# Altium schematic symbol library jlcpcb_2025_04_capacitors_extended_0402.schlib: 3594 symbols (part 4 of 20) (continued)
## 04025A8R2CAT2A
designator C?  Capacitance: 8.2pF  (hidden comment: *)
Capacitor, Ceramic (MLCC), 8.2pF, 50V, C0G, SMD 0402; Manufacturer: AVX; Manufacturer Part Number: 04025A8R2CAT2A; Package Size: 0402; JLCPCB Basic Part: No; JLCPCB Part Number: C167419; Supplier 1: LCSC; Category: Capacitors - MLCC; Supplier Part Number 1: C167419; Voltage Rating: 50V; Temperature Coefficient: C0G; RoHS: Yes; ComponentLink1Description: Datasheet; ComponentLink1URL: https://wmsc.lcsc.com/wmsc/upload/file/pdf/v2/lcsc/2304140030_Kyocera-AVX-04025A8R2CAT2A_C167419.pdf; ComponentLink2Description: JLCPCB Part URL; ComponentLink2URL: https://jlcpcb.com/partdetail/C167419; ComponentLink3Description: LCSC Part URL; ComponentLink3URL: https://lcsc.com/product-detail/Multilayer-Ceramic-Capacitors-MLCC---SMD-SMT_Kyocera-AVX-Kyocera-AVX-04025A8R2CAT2A_C167419.html
footprint CAP-0402 (0402 (1005M) Capacitor)
pins: 1, 2

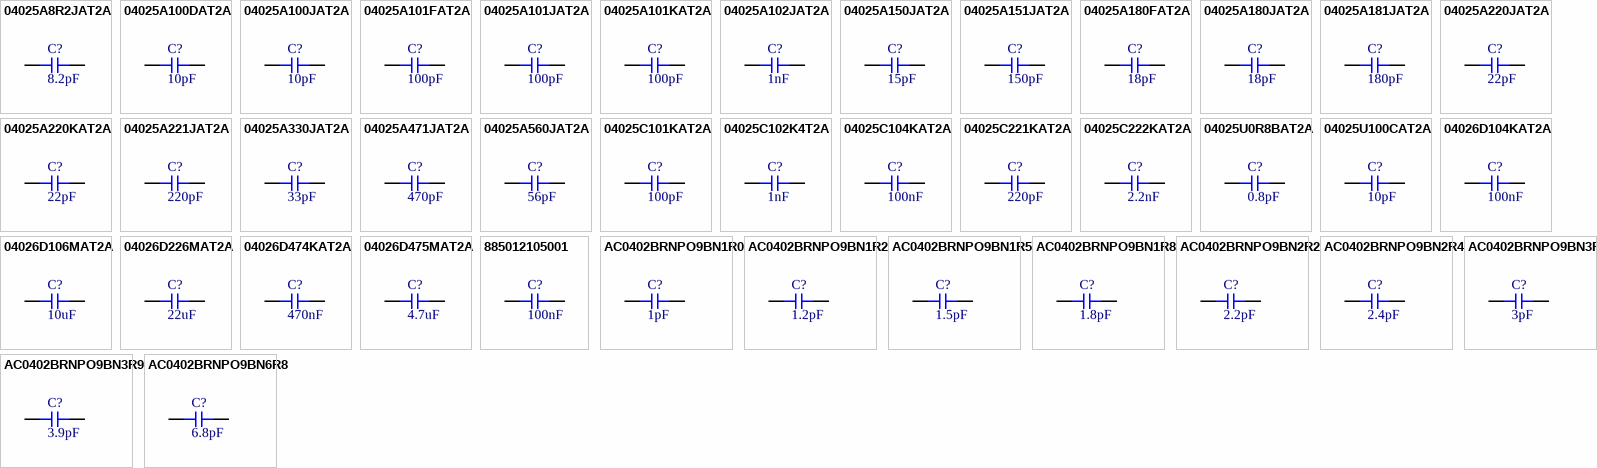
[diagram p16: symbols 04025A8R2JAT2A to AC0402BRNPO9BN6R8]

## 04025A8R2JAT2A
designator C?  Capacitance: 8.2pF  (hidden comment: *)
Capacitor, Ceramic (MLCC), 8.2pF, ±5%, 50V, C0G, ±5%, SMD 0402; Manufacturer: Kyocera AVX; Manufacturer Part Number: 04025A8R2JAT2A; Package Size: 0402; JLCPCB Basic Part: No; JLCPCB Part Number: C2180688; Supplier 1: LCSC; Category: Capacitors - MLCC; Supplier Part Number 1: C2180688; Tolerance: ±5%; Voltage Rating: 50V; Temperature Coefficient: C0G; RoHS: Yes; ComponentLink1Description: Datasheet; ComponentLink1URL: https://wmsc.lcsc.com/wmsc/upload/file/pdf/v2/lcsc/2304140030_Kyocera-AVX-04025A8R2JAT2A_C2180688.pdf; ComponentLink2Description: JLCPCB Part URL; ComponentLink2URL: https://jlcpcb.com/partdetail/C2180688; ComponentLink3Description: LCSC Part URL; ComponentLink3URL: https://lcsc.com/product-detail/Multilayer-Ceramic-Capacitors-MLCC---SMD-SMT_Kyocera-AVX-Kyocera-AVX-04025A8R2JAT2A_C2180688.html
footprint CAP-0402 (0402 (1005M) Capacitor)
pins: 1, 2

## 04025A100DAT2A
designator C?  Capacitance: 10pF  (hidden comment: *)
Capacitor, Ceramic (MLCC), 10pF, 50V, C0G, SMD 0402; Manufacturer: AVX; Manufacturer Part Number: 04025A100DAT2A; Package Size: 0402; JLCPCB Basic Part: No; JLCPCB Part Number: C167427; Supplier 1: LCSC; Category: Capacitors - MLCC; Supplier Part Number 1: C167427; Voltage Rating: 50V; Temperature Coefficient: C0G; RoHS: Yes; ComponentLink1Description: Datasheet; ComponentLink1URL: https://wmsc.lcsc.com/wmsc/upload/file/pdf/v2/lcsc/2304140030_Kyocera-AVX-04025A100DAT2A_C167427.pdf; ComponentLink2Description: JLCPCB Part URL; ComponentLink2URL: https://jlcpcb.com/partdetail/C167427; ComponentLink3Description: LCSC Part URL; ComponentLink3URL: https://lcsc.com/product-detail/Multilayer-Ceramic-Capacitors-MLCC---SMD-SMT_Kyocera-AVX-Kyocera-AVX-04025A100DAT2A_C167427.html
footprint CAP-0402 (0402 (1005M) Capacitor)
pins: 1, 2

## 04025A100JAT2A
designator C?  Capacitance: 10pF  (hidden comment: *)
Capacitor, Ceramic (MLCC), 10pF, ±5%, 50V, C0G, ±5%, SMD 0402; Manufacturer: AVX; Manufacturer Part Number: 04025A100JAT2A; Package Size: 0402; JLCPCB Basic Part: No; JLCPCB Part Number: C513314; Supplier 1: LCSC; Category: Capacitors - MLCC; Supplier Part Number 1: C513314; Tolerance: ±5%; Voltage Rating: 50V; Temperature Coefficient: C0G; RoHS: Yes; ComponentLink1Description: Datasheet; ComponentLink1URL: https://wmsc.lcsc.com/wmsc/upload/file/pdf/v2/lcsc/2304140030_Kyocera-AVX-04025A100JAT2A_C513314.pdf; ComponentLink2Description: JLCPCB Part URL; ComponentLink2URL: https://jlcpcb.com/partdetail/C513314; ComponentLink3Description: LCSC Part URL; ComponentLink3URL: https://lcsc.com/product-detail/Multilayer-Ceramic-Capacitors-MLCC---SMD-SMT_Kyocera-AVX-Kyocera-AVX-04025A100JAT2A_C513314.html
footprint CAP-0402 (0402 (1005M) Capacitor)
pins: 1, 2

## 04025A101FAT2A
designator C?  Capacitance: 100pF  (hidden comment: *)
Capacitor, Ceramic (MLCC), 100pF, ±1%, 50V, C0G, ±1%, SMD 0402; Manufacturer: AVX; Manufacturer Part Number: 04025A101FAT2A; Package Size: 0402; JLCPCB Basic Part: No; JLCPCB Part Number: C597012; Supplier 1: LCSC; Category: Capacitors - MLCC; Supplier Part Number 1: C597012; Tolerance: ±1%; Voltage Rating: 50V; Temperature Coefficient: C0G; RoHS: Yes; ComponentLink1Description: Datasheet; ComponentLink1URL: https://wmsc.lcsc.com/wmsc/upload/file/pdf/v2/lcsc/2304140030_Kyocera-AVX-04025A101FAT2A_C597012.pdf; ComponentLink2Description: JLCPCB Part URL; ComponentLink2URL: https://jlcpcb.com/partdetail/C597012; ComponentLink3Description: LCSC Part URL; ComponentLink3URL: https://lcsc.com/product-detail/Multilayer-Ceramic-Capacitors-MLCC---SMD-SMT_Kyocera-AVX-Kyocera-AVX-04025A101FAT2A_C597012.html
footprint CAP-0402 (0402 (1005M) Capacitor)
pins: 1, 2

## 04025A101JAT2A
designator C?  Capacitance: 100pF  (hidden comment: *)
Capacitor, Ceramic (MLCC), 100pF, ±5%, 50V, C0G, ±5%, SMD 0402; Manufacturer: AVX; Manufacturer Part Number: 04025A101JAT2A; Package Size: 0402; JLCPCB Basic Part: No; JLCPCB Part Number: C597014; Supplier 1: LCSC; Category: Capacitors - MLCC; Supplier Part Number 1: C597014; Tolerance: ±5%; Voltage Rating: 50V; Temperature Coefficient: C0G; RoHS: Yes; ComponentLink1Description: Datasheet; ComponentLink1URL: https://wmsc.lcsc.com/wmsc/upload/file/pdf/v2/lcsc/2304140030_Kyocera-AVX-04025A101JAT2A_C597014.pdf; ComponentLink2Description: JLCPCB Part URL; ComponentLink2URL: https://jlcpcb.com/partdetail/C597014; ComponentLink3Description: LCSC Part URL; ComponentLink3URL: https://lcsc.com/product-detail/Multilayer-Ceramic-Capacitors-MLCC---SMD-SMT_Kyocera-AVX-Kyocera-AVX-04025A101JAT2A_C597014.html
footprint CAP-0402 (0402 (1005M) Capacitor)
pins: 1, 2

## 04025A101KAT2A
designator C?  Capacitance: 100pF  (hidden comment: *)
Capacitor, Ceramic (MLCC), 100pF, ±10%, 50V, C0G, ±10%, SMD 0402; Manufacturer: AVX; Manufacturer Part Number: 04025A101KAT2A; Package Size: 0402; JLCPCB Basic Part: No; JLCPCB Part Number: C597015; Supplier 1: LCSC; Category: Capacitors - MLCC; Supplier Part Number 1: C597015; Tolerance: ±10%; Voltage Rating: 50V; Temperature Coefficient: C0G; RoHS: Yes; ComponentLink1Description: Datasheet; ComponentLink1URL: https://wmsc.lcsc.com/wmsc/upload/file/pdf/v2/lcsc/2304140030_Kyocera-AVX-04025A101KAT2A_C597015.pdf; ComponentLink2Description: JLCPCB Part URL; ComponentLink2URL: https://jlcpcb.com/partdetail/C597015; ComponentLink3Description: LCSC Part URL; ComponentLink3URL: https://lcsc.com/product-detail/Multilayer-Ceramic-Capacitors-MLCC---SMD-SMT_Kyocera-AVX-Kyocera-AVX-04025A101KAT2A_C597015.html
footprint CAP-0402 (0402 (1005M) Capacitor)
pins: 1, 2

## 04025A102JAT2A
designator C?  Capacitance: 1nF  (hidden comment: *)
Capacitor, Ceramic (MLCC), 1nF, ±5%, 50V, C0G, ±5%, SMD 0402; Manufacturer: AVX; Manufacturer Part Number: 04025A102JAT2A; Package Size: 0402; JLCPCB Basic Part: No; JLCPCB Part Number: C597016; Supplier 1: LCSC; Category: Capacitors - MLCC; Supplier Part Number 1: C597016; Tolerance: ±5%; Voltage Rating: 50V; Temperature Coefficient: C0G; RoHS: Yes; ComponentLink1Description: Datasheet; ComponentLink1URL: https://wmsc.lcsc.com/wmsc/upload/file/pdf/v2/lcsc/2304140030_Kyocera-AVX-04025A102JAT2A_C597016.pdf; ComponentLink2Description: JLCPCB Part URL; ComponentLink2URL: https://jlcpcb.com/partdetail/C597016; ComponentLink3Description: LCSC Part URL; ComponentLink3URL: https://lcsc.com/product-detail/Multilayer-Ceramic-Capacitors-MLCC---SMD-SMT_Kyocera-AVX-Kyocera-AVX-04025A102JAT2A_C597016.html
footprint CAP-0402 (0402 (1005M) Capacitor)
pins: 1, 2

## 04025A150JAT2A
designator C?  Capacitance: 15pF  (hidden comment: *)
Capacitor, Ceramic (MLCC), 15pF, ±5%, 50V, C0G, ±5%, SMD 0402; Manufacturer: AVX; Manufacturer Part Number: 04025A150JAT2A; Package Size: 0402; JLCPCB Basic Part: No; JLCPCB Part Number: C513315; Supplier 1: LCSC; Category: Capacitors - MLCC; Supplier Part Number 1: C513315; Tolerance: ±5%; Voltage Rating: 50V; Temperature Coefficient: C0G; RoHS: Yes; ComponentLink1Description: Datasheet; ComponentLink1URL: https://wmsc.lcsc.com/wmsc/upload/file/pdf/v2/lcsc/2304140030_Kyocera-AVX-04025A150JAT2A_C513315.pdf; ComponentLink2Description: JLCPCB Part URL; ComponentLink2URL: https://jlcpcb.com/partdetail/C513315; ComponentLink3Description: LCSC Part URL; ComponentLink3URL: https://lcsc.com/product-detail/Multilayer-Ceramic-Capacitors-MLCC---SMD-SMT_Kyocera-AVX-Kyocera-AVX-04025A150JAT2A_C513315.html
footprint CAP-0402 (0402 (1005M) Capacitor)
pins: 1, 2

## 04025A151JAT2A
designator C?  Capacitance: 150pF  (hidden comment: *)
Capacitor, Ceramic (MLCC), 150pF, ±5%, 50V, C0G, ±5%, SMD 0402; Manufacturer: Kyocera AVX; Manufacturer Part Number: 04025A151JAT2A; Package Size: 0402; JLCPCB Basic Part: No; JLCPCB Part Number: C2169331; Supplier 1: LCSC; Category: Capacitors - MLCC; Supplier Part Number 1: C2169331; Tolerance: ±5%; Voltage Rating: 50V; Temperature Coefficient: C0G; RoHS: Yes; ComponentLink1Description: Datasheet; ComponentLink1URL: https://wmsc.lcsc.com/wmsc/upload/file/pdf/v2/lcsc/2304140030_Kyocera-AVX-04025A151JAT2A_C2169331.pdf; ComponentLink2Description: JLCPCB Part URL; ComponentLink2URL: https://jlcpcb.com/partdetail/C2169331; ComponentLink3Description: LCSC Part URL; ComponentLink3URL: https://lcsc.com/product-detail/Multilayer-Ceramic-Capacitors-MLCC---SMD-SMT_Kyocera-AVX-Kyocera-AVX-04025A151JAT2A_C2169331.html
footprint CAP-0402 (0402 (1005M) Capacitor)
pins: 1, 2

## 04025A180FAT2A
designator C?  Capacitance: 18pF  (hidden comment: *)
Capacitor, Ceramic (MLCC), 18pF, ±1%, 50V, C0G, ±1%, SMD 0402; Manufacturer: AVX; Manufacturer Part Number: 04025A180FAT2A; Package Size: 0402; JLCPCB Basic Part: No; JLCPCB Part Number: C597018; Supplier 1: LCSC; Category: Capacitors - MLCC; Supplier Part Number 1: C597018; Tolerance: ±1%; Voltage Rating: 50V; Temperature Coefficient: C0G; RoHS: Yes; ComponentLink1Description: Datasheet; ComponentLink1URL: https://wmsc.lcsc.com/wmsc/upload/file/pdf/v2/lcsc/2304140030_Kyocera-AVX-04025A180FAT2A_C597018.pdf; ComponentLink2Description: JLCPCB Part URL; ComponentLink2URL: https://jlcpcb.com/partdetail/C597018; ComponentLink3Description: LCSC Part URL; ComponentLink3URL: https://lcsc.com/product-detail/Multilayer-Ceramic-Capacitors-MLCC---SMD-SMT_Kyocera-AVX-Kyocera-AVX-04025A180FAT2A_C597018.html
footprint CAP-0402 (0402 (1005M) Capacitor)
pins: 1, 2

## 04025A180JAT2A
designator C?  Capacitance: 18pF  (hidden comment: *)
Capacitor, Ceramic (MLCC), 18pF, ±5%, 50V, C0G, ±5%, SMD 0402; Manufacturer: AVX; Manufacturer Part Number: 04025A180JAT2A; Package Size: 0402; JLCPCB Basic Part: No; JLCPCB Part Number: C513316; Supplier 1: LCSC; Category: Capacitors - MLCC; Supplier Part Number 1: C513316; Tolerance: ±5%; Voltage Rating: 50V; Temperature Coefficient: C0G; RoHS: Yes; ComponentLink1Description: Datasheet; ComponentLink1URL: https://wmsc.lcsc.com/wmsc/upload/file/pdf/v2/lcsc/2304140030_Kyocera-AVX-04025A180JAT2A_C513316.pdf; ComponentLink2Description: JLCPCB Part URL; ComponentLink2URL: https://jlcpcb.com/partdetail/C513316; ComponentLink3Description: LCSC Part URL; ComponentLink3URL: https://lcsc.com/product-detail/Multilayer-Ceramic-Capacitors-MLCC---SMD-SMT_Kyocera-AVX-Kyocera-AVX-04025A180JAT2A_C513316.html
footprint CAP-0402 (0402 (1005M) Capacitor)
pins: 1, 2

## 04025A181JAT2A
designator C?  Capacitance: 180pF  (hidden comment: *)
Capacitor, Ceramic (MLCC), 180pF, ±5%, 50V, C0G, ±5%, SMD 0402; Manufacturer: Kyocera AVX; Manufacturer Part Number: 04025A181JAT2A; Package Size: 0402; JLCPCB Basic Part: No; JLCPCB Part Number: C2170341; Supplier 1: LCSC; Category: Capacitors - MLCC; Supplier Part Number 1: C2170341; Tolerance: ±5%; Voltage Rating: 50V; Temperature Coefficient: C0G; RoHS: Yes; ComponentLink1Description: Datasheet; ComponentLink1URL: https://wmsc.lcsc.com/wmsc/upload/file/pdf/v2/lcsc/2304140030_Kyocera-AVX-04025A181JAT2A_C2170341.pdf; ComponentLink2Description: JLCPCB Part URL; ComponentLink2URL: https://jlcpcb.com/partdetail/C2170341; ComponentLink3Description: LCSC Part URL; ComponentLink3URL: https://lcsc.com/product-detail/Multilayer-Ceramic-Capacitors-MLCC---SMD-SMT_Kyocera-AVX-Kyocera-AVX-04025A181JAT2A_C2170341.html
footprint CAP-0402 (0402 (1005M) Capacitor)
pins: 1, 2

## 04025A220JAT2A
designator C?  Capacitance: 22pF  (hidden comment: *)
Capacitor, Ceramic (MLCC), 22pF, ±5%, 50V, C0G, ±5%, SMD 0402; Manufacturer: AVX; Manufacturer Part Number: 04025A220JAT2A; Package Size: 0402; JLCPCB Basic Part: No; JLCPCB Part Number: C167428; Supplier 1: LCSC; Category: Capacitors - MLCC; Supplier Part Number 1: C167428; Tolerance: ±5%; Voltage Rating: 50V; Temperature Coefficient: C0G; RoHS: Yes; ComponentLink1Description: Datasheet; ComponentLink1URL: https://wmsc.lcsc.com/wmsc/upload/file/pdf/v2/lcsc/2304140030_Kyocera-AVX-04025A220JAT2A_C167428.pdf; ComponentLink2Description: JLCPCB Part URL; ComponentLink2URL: https://jlcpcb.com/partdetail/C167428; ComponentLink3Description: LCSC Part URL; ComponentLink3URL: https://lcsc.com/product-detail/Multilayer-Ceramic-Capacitors-MLCC---SMD-SMT_Kyocera-AVX-Kyocera-AVX-04025A220JAT2A_C167428.html
footprint CAP-0402 (0402 (1005M) Capacitor)
pins: 1, 2

## 04025A220KAT2A
designator C?  Capacitance: 22pF  (hidden comment: *)
Capacitor, Ceramic (MLCC), 22pF, ±10%, 50V, C0G, ±10%, SMD 0402; Manufacturer: AVX; Manufacturer Part Number: 04025A220KAT2A; Package Size: 0402; JLCPCB Basic Part: No; JLCPCB Part Number: C597024; Supplier 1: LCSC; Category: Capacitors - MLCC; Supplier Part Number 1: C597024; Tolerance: ±10%; Voltage Rating: 50V; Temperature Coefficient: C0G; RoHS: Yes; ComponentLink1Description: Datasheet; ComponentLink1URL: https://wmsc.lcsc.com/wmsc/upload/file/pdf/v2/lcsc/2304140030_Kyocera-AVX-04025A220KAT2A_C597024.pdf; ComponentLink2Description: JLCPCB Part URL; ComponentLink2URL: https://jlcpcb.com/partdetail/C597024; ComponentLink3Description: LCSC Part URL; ComponentLink3URL: https://lcsc.com/product-detail/Multilayer-Ceramic-Capacitors-MLCC---SMD-SMT_Kyocera-AVX-Kyocera-AVX-04025A220KAT2A_C597024.html
footprint CAP-0402 (0402 (1005M) Capacitor)
pins: 1, 2

## 04025A221JAT2A
designator C?  Capacitance: 220pF  (hidden comment: *)
Capacitor, Ceramic (MLCC), 220pF, ±5%, 50V, C0G, ±5%, SMD 0402; Manufacturer: AVX; Manufacturer Part Number: 04025A221JAT2A; Package Size: 0402; JLCPCB Basic Part: No; JLCPCB Part Number: C597026; Supplier 1: LCSC; Category: Capacitors - MLCC; Supplier Part Number 1: C597026; Tolerance: ±5%; Voltage Rating: 50V; Temperature Coefficient: C0G; RoHS: Yes; ComponentLink1Description: Datasheet; ComponentLink1URL: https://wmsc.lcsc.com/wmsc/upload/file/pdf/v2/lcsc/2304140030_Kyocera-AVX-04025A221JAT2A_C597026.pdf; ComponentLink2Description: JLCPCB Part URL; ComponentLink2URL: https://jlcpcb.com/partdetail/C597026; ComponentLink3Description: LCSC Part URL; ComponentLink3URL: https://lcsc.com/product-detail/Multilayer-Ceramic-Capacitors-MLCC---SMD-SMT_Kyocera-AVX-Kyocera-AVX-04025A221JAT2A_C597026.html
footprint CAP-0402 (0402 (1005M) Capacitor)
pins: 1, 2

## 04025A330JAT2A
designator C?  Capacitance: 33pF  (hidden comment: *)
Capacitor, Ceramic (MLCC), 33pF, ±5%, 50V, C0G, ±5%, SMD 0402; Manufacturer: AVX; Manufacturer Part Number: 04025A330JAT2A; Package Size: 0402; JLCPCB Basic Part: No; JLCPCB Part Number: C513317; Supplier 1: LCSC; Category: Capacitors - MLCC; Supplier Part Number 1: C513317; Tolerance: ±5%; Voltage Rating: 50V; Temperature Coefficient: C0G; RoHS: Yes; ComponentLink1Description: Datasheet; ComponentLink1URL: https://wmsc.lcsc.com/wmsc/upload/file/pdf/v2/lcsc/2304140030_Kyocera-AVX-04025A330JAT2A_C513317.pdf; ComponentLink2Description: JLCPCB Part URL; ComponentLink2URL: https://jlcpcb.com/partdetail/C513317; ComponentLink3Description: LCSC Part URL; ComponentLink3URL: https://lcsc.com/product-detail/Multilayer-Ceramic-Capacitors-MLCC---SMD-SMT_Kyocera-AVX-Kyocera-AVX-04025A330JAT2A_C513317.html
footprint CAP-0402 (0402 (1005M) Capacitor)
pins: 1, 2

## 04025A471JAT2A
designator C?  Capacitance: 470pF  (hidden comment: *)
Capacitor, Ceramic (MLCC), 470pF, ±5%, 50V, C0G, ±5%, SMD 0402; Manufacturer: AVX; Manufacturer Part Number: 04025A471JAT2A; Package Size: 0402; JLCPCB Basic Part: No; JLCPCB Part Number: C597032; Supplier 1: LCSC; Category: Capacitors - MLCC; Supplier Part Number 1: C597032; Tolerance: ±5%; Voltage Rating: 50V; Temperature Coefficient: C0G; RoHS: Yes; ComponentLink1Description: Datasheet; ComponentLink1URL: https://wmsc.lcsc.com/wmsc/upload/file/pdf/v2/lcsc/2304140030_Kyocera-AVX-04025A471JAT2A_C597032.pdf; ComponentLink2Description: JLCPCB Part URL; ComponentLink2URL: https://jlcpcb.com/partdetail/C597032; ComponentLink3Description: LCSC Part URL; ComponentLink3URL: https://lcsc.com/product-detail/Multilayer-Ceramic-Capacitors-MLCC---SMD-SMT_Kyocera-AVX-Kyocera-AVX-04025A471JAT2A_C597032.html
footprint CAP-0402 (0402 (1005M) Capacitor)
pins: 1, 2

## 04025A560JAT2A
designator C?  Capacitance: 56pF  (hidden comment: *)
Capacitor, Ceramic (MLCC), 56pF, ±5%, 50V, C0G, ±5%, SMD 0402; Manufacturer: AVX; Manufacturer Part Number: 04025A560JAT2A; Package Size: 0402; JLCPCB Basic Part: No; JLCPCB Part Number: C597034; Supplier 1: LCSC; Category: Capacitors - MLCC; Supplier Part Number 1: C597034; Tolerance: ±5%; Voltage Rating: 50V; Temperature Coefficient: C0G; RoHS: Yes; ComponentLink1Description: Datasheet; ComponentLink1URL: https://wmsc.lcsc.com/wmsc/upload/file/pdf/v2/lcsc/2304140030_Kyocera-AVX-04025A560JAT2A_C597034.pdf; ComponentLink2Description: JLCPCB Part URL; ComponentLink2URL: https://jlcpcb.com/partdetail/C597034; ComponentLink3Description: LCSC Part URL; ComponentLink3URL: https://lcsc.com/product-detail/Multilayer-Ceramic-Capacitors-MLCC---SMD-SMT_Kyocera-AVX-Kyocera-AVX-04025A560JAT2A_C597034.html
footprint CAP-0402 (0402 (1005M) Capacitor)
pins: 1, 2

## 04025C101KAT2A
designator C?  Capacitance: 100pF  (hidden comment: *)
Capacitor, Ceramic (MLCC), 100pF, ±10%, 50V, X7R, ±10%, SMD 0402; Manufacturer: Kyocera AVX; Manufacturer Part Number: 04025C101KAT2A; Package Size: 0402; JLCPCB Basic Part: No; JLCPCB Part Number: C2155182; Supplier 1: LCSC; Category: Capacitors - MLCC; Supplier Part Number 1: C2155182; Tolerance: ±10%; Voltage Rating: 50V; Temperature Coefficient: X7R; RoHS: Yes; ComponentLink1Description: Datasheet; ComponentLink1URL: https://wmsc.lcsc.com/wmsc/upload/file/pdf/v2/lcsc/2304140030_Kyocera-AVX-04025C101KAT2A_C2155182.pdf; ComponentLink2Description: JLCPCB Part URL; ComponentLink2URL: https://jlcpcb.com/partdetail/C2155182; ComponentLink3Description: LCSC Part URL; ComponentLink3URL: https://lcsc.com/product-detail/Multilayer-Ceramic-Capacitors-MLCC---SMD-SMT_Kyocera-AVX-Kyocera-AVX-04025C101KAT2A_C2155182.html
footprint CAP-0402 (0402 (1005M) Capacitor)
pins: 1, 2

## 04025C102K4T2A
designator C?  Capacitance: 1nF  (hidden comment: *)
Capacitor, Ceramic (MLCC), 1nF, ±10%, 50V, X7R, ±10%, SMD 0402; Manufacturer: AVX; Manufacturer Part Number: 04025C102K4T2A; Package Size: 0402; JLCPCB Basic Part: No; JLCPCB Part Number: C779974; Supplier 1: LCSC; Category: Capacitors - MLCC; Supplier Part Number 1: C779974; Tolerance: ±10%; Voltage Rating: 50V; Temperature Coefficient: X7R; RoHS: Yes; ComponentLink1Description: Datasheet; ComponentLink1URL: https://wmsc.lcsc.com/wmsc/upload/file/pdf/v2/lcsc/2304140030_Kyocera-AVX-04025C102K4T2A_C779974.pdf; ComponentLink2Description: JLCPCB Part URL; ComponentLink2URL: https://jlcpcb.com/partdetail/C779974; ComponentLink3Description: LCSC Part URL; ComponentLink3URL: https://lcsc.com/product-detail/Multilayer-Ceramic-Capacitors-MLCC---SMD-SMT_Kyocera-AVX-Kyocera-AVX-04025C102K4T2A_C779974.html
footprint CAP-0402 (0402 (1005M) Capacitor)
pins: 1, 2

## 04025C104KAT2A
designator C?  Capacitance: 100nF  (hidden comment: *)
Capacitor, Ceramic (MLCC), 100nF, ±10%, 50V, X7R, ±10%, SMD 0402; Manufacturer: Kyocera AVX; Manufacturer Part Number: 04025C104KAT2A; Package Size: 0402; JLCPCB Basic Part: No; JLCPCB Part Number: C2167244; Supplier 1: LCSC; Category: Capacitors - MLCC; Supplier Part Number 1: C2167244; Tolerance: ±10%; Voltage Rating: 50V; Temperature Coefficient: X7R; RoHS: Yes; ComponentLink1Description: Datasheet; ComponentLink1URL: https://wmsc.lcsc.com/wmsc/upload/file/pdf/v2/lcsc/2304140030_Kyocera-AVX-04025C104KAT2A_C2167244.pdf; ComponentLink2Description: JLCPCB Part URL; ComponentLink2URL: https://jlcpcb.com/partdetail/C2167244; ComponentLink3Description: LCSC Part URL; ComponentLink3URL: https://lcsc.com/product-detail/Multilayer-Ceramic-Capacitors-MLCC---SMD-SMT_Kyocera-AVX-Kyocera-AVX-04025C104KAT2A_C2167244.html
footprint CAP-0402 (0402 (1005M) Capacitor)
pins: 1, 2

## 04025C221KAT2A
designator C?  Capacitance: 220pF  (hidden comment: *)
Capacitor, Ceramic (MLCC), 220pF, ±10%, 50V, X7R, ±10%, SMD 0402; Manufacturer: AVX; Manufacturer Part Number: 04025C221KAT2A; Package Size: 0402; JLCPCB Basic Part: No; JLCPCB Part Number: C513319; Supplier 1: LCSC; Category: Capacitors - MLCC; Supplier Part Number 1: C513319; Tolerance: ±10%; Voltage Rating: 50V; Temperature Coefficient: X7R; RoHS: Yes; ComponentLink1Description: Datasheet; ComponentLink1URL: https://wmsc.lcsc.com/wmsc/upload/file/pdf/v2/lcsc/2304140030_Kyocera-AVX-04025C221KAT2A_C513319.pdf; ComponentLink2Description: JLCPCB Part URL; ComponentLink2URL: https://jlcpcb.com/partdetail/C513319; ComponentLink3Description: LCSC Part URL; ComponentLink3URL: https://lcsc.com/product-detail/Multilayer-Ceramic-Capacitors-MLCC---SMD-SMT_Kyocera-AVX-Kyocera-AVX-04025C221KAT2A_C513319.html
footprint CAP-0402 (0402 (1005M) Capacitor)
pins: 1, 2

## 04025C222KAT2A
designator C?  Capacitance: 2.2nF  (hidden comment: *)
Capacitor, Ceramic (MLCC), 2.2nF, ±10%, 50V, X7R, ±10%, SMD 0402; Manufacturer: Kyocera AVX; Manufacturer Part Number: 04025C222KAT2A; Package Size: 0402; JLCPCB Basic Part: No; JLCPCB Part Number: C2167225; Supplier 1: LCSC; Category: Capacitors - MLCC; Supplier Part Number 1: C2167225; Tolerance: ±10%; Voltage Rating: 50V; Temperature Coefficient: X7R; RoHS: Yes; ComponentLink1Description: Datasheet; ComponentLink1URL: https://wmsc.lcsc.com/wmsc/upload/file/pdf/v2/lcsc/2304140030_Kyocera-AVX-04025C222KAT2A_C2167225.pdf; ComponentLink2Description: JLCPCB Part URL; ComponentLink2URL: https://jlcpcb.com/partdetail/C2167225; ComponentLink3Description: LCSC Part URL; ComponentLink3URL: https://lcsc.com/product-detail/Multilayer-Ceramic-Capacitors-MLCC---SMD-SMT_Kyocera-AVX-Kyocera-AVX-04025C222KAT2A_C2167225.html
footprint CAP-0402 (0402 (1005M) Capacitor)
pins: 1, 2

## 04025U0R8BAT2A
designator C?  Capacitance: 0.8pF  (hidden comment: *)
Capacitor, Ceramic (MLCC), 0.8pF, 50V, C0G, SMD 0402; Manufacturer: Kyocera AVX; Manufacturer Part Number: 04025U0R8BAT2A; Package Size: 0402; JLCPCB Basic Part: No; JLCPCB Part Number: C2176642; Supplier 1: LCSC; Category: Capacitors - MLCC; Supplier Part Number 1: C2176642; Voltage Rating: 50V; Temperature Coefficient: C0G; RoHS: Yes; ComponentLink1Description: Datasheet; ComponentLink1URL: https://wmsc.lcsc.com/wmsc/upload/file/pdf/v2/lcsc/2304140030_Kyocera-AVX-04025U0R8BAT2A_C2176642.pdf; ComponentLink2Description: JLCPCB Part URL; ComponentLink2URL: https://jlcpcb.com/partdetail/C2176642; ComponentLink3Description: LCSC Part URL; ComponentLink3URL: https://lcsc.com/product-detail/Multilayer-Ceramic-Capacitors-MLCC---SMD-SMT_Kyocera-AVX-Kyocera-AVX-04025U0R8BAT2A_C2176642.html
footprint CAP-0402 (0402 (1005M) Capacitor)
pins: 1, 2

## 04025U100CAT2A
designator C?  Capacitance: 10pF  (hidden comment: *)
Capacitor, Ceramic (MLCC), 10pF, 50V, C0G, SMD 0402; Manufacturer: Kyocera AVX; Manufacturer Part Number: 04025U100CAT2A; Package Size: 0402; JLCPCB Basic Part: No; JLCPCB Part Number: C2168995; Supplier 1: LCSC; Category: Capacitors - MLCC; Supplier Part Number 1: C2168995; Voltage Rating: 50V; Temperature Coefficient: C0G; RoHS: Yes; ComponentLink1Description: Datasheet; ComponentLink1URL: https://wmsc.lcsc.com/wmsc/upload/file/pdf/v2/lcsc/2304140030_Kyocera-AVX-04025U100CAT2A_C2168995.pdf; ComponentLink2Description: JLCPCB Part URL; ComponentLink2URL: https://jlcpcb.com/partdetail/C2168995; ComponentLink3Description: LCSC Part URL; ComponentLink3URL: https://lcsc.com/product-detail/Multilayer-Ceramic-Capacitors-MLCC---SMD-SMT_Kyocera-AVX-Kyocera-AVX-04025U100CAT2A_C2168995.html
footprint CAP-0402 (0402 (1005M) Capacitor)
pins: 1, 2

## 04026D104KAT2A
designator C?  Capacitance: 100nF  (hidden comment: *)
Capacitor, Ceramic (MLCC), 100nF, ±10%, 6.3V, X5R, ±10%, SMD 0402; Manufacturer: Kyocera AVX; Manufacturer Part Number: 04026D104KAT2A; Package Size: 0402; JLCPCB Basic Part: No; JLCPCB Part Number: C2176584; Supplier 1: LCSC; Category: Capacitors - MLCC; Supplier Part Number 1: C2176584; Tolerance: ±10%; Voltage Rating: 6.3V; Temperature Coefficient: X5R; RoHS: Yes; ComponentLink1Description: Datasheet; ComponentLink1URL: https://wmsc.lcsc.com/wmsc/upload/file/pdf/v2/lcsc/2304140030_Kyocera-AVX-04026D104KAT2A_C2176584.pdf; ComponentLink2Description: JLCPCB Part URL; ComponentLink2URL: https://jlcpcb.com/partdetail/C2176584; ComponentLink3Description: LCSC Part URL; ComponentLink3URL: https://lcsc.com/product-detail/Multilayer-Ceramic-Capacitors-MLCC---SMD-SMT_Kyocera-AVX-Kyocera-AVX-04026D104KAT2A_C2176584.html
footprint CAP-0402 (0402 (1005M) Capacitor)
pins: 1, 2

## 04026D106MAT2A
designator C?  Capacitance: 10uF  (hidden comment: *)
Capacitor, Ceramic (MLCC), 10uF, ±20%, 6.3V, X5R, ±20%, SMD 0402; Manufacturer: Kyocera AVX; Manufacturer Part Number: 04026D106MAT2A; Package Size: 0402; JLCPCB Basic Part: No; JLCPCB Part Number: C2178725; Supplier 1: LCSC; Category: Capacitors - MLCC; Supplier Part Number 1: C2178725; Tolerance: ±20%; Voltage Rating: 6.3V; Temperature Coefficient: X5R; RoHS: Yes; ComponentLink1Description: Datasheet; ComponentLink1URL: https://wmsc.lcsc.com/wmsc/upload/file/pdf/v2/lcsc/2304140030_Kyocera-AVX-04026D106MAT2A_C2178725.pdf; ComponentLink2Description: JLCPCB Part URL; ComponentLink2URL: https://jlcpcb.com/partdetail/C2178725; ComponentLink3Description: LCSC Part URL; ComponentLink3URL: https://lcsc.com/product-detail/Multilayer-Ceramic-Capacitors-MLCC---SMD-SMT_Kyocera-AVX-Kyocera-AVX-04026D106MAT2A_C2178725.html
footprint CAP-0402 (0402 (1005M) Capacitor)
pins: 1, 2

## 04026D226MAT2A
designator C?  Capacitance: 22uF  (hidden comment: *)
Capacitor, Ceramic (MLCC), 22uF, ±20%, 6.3V, X5R, ±20%, SMD 0402; Manufacturer: Kyocera AVX; Manufacturer Part Number: 04026D226MAT2A; Package Size: 0402; JLCPCB Basic Part: No; JLCPCB Part Number: C2179118; Supplier 1: LCSC; Category: Capacitors - MLCC; Supplier Part Number 1: C2179118; Tolerance: ±20%; Voltage Rating: 6.3V; Temperature Coefficient: X5R; RoHS: Yes; ComponentLink1Description: Datasheet; ComponentLink1URL: https://wmsc.lcsc.com/wmsc/upload/file/pdf/v2/lcsc/2304140030_Kyocera-AVX-04026D226MAT2A_C2179118.pdf; ComponentLink2Description: JLCPCB Part URL; ComponentLink2URL: https://jlcpcb.com/partdetail/C2179118; ComponentLink3Description: LCSC Part URL; ComponentLink3URL: https://lcsc.com/product-detail/Multilayer-Ceramic-Capacitors-MLCC---SMD-SMT_Kyocera-AVX-Kyocera-AVX-04026D226MAT2A_C2179118.html
footprint CAP-0402 (0402 (1005M) Capacitor)
pins: 1, 2

## 04026D474KAT2A
designator C?  Capacitance: 470nF  (hidden comment: *)
Capacitor, Ceramic (MLCC), 470nF, ±10%, 6.3V, X5R, ±10%, SMD 0402; Manufacturer: AVX; Manufacturer Part Number: 04026D474KAT2A; Package Size: 0402; JLCPCB Basic Part: No; JLCPCB Part Number: C597049; Supplier 1: LCSC; Category: Capacitors - MLCC; Supplier Part Number 1: C597049; Tolerance: ±10%; Voltage Rating: 6.3V; Temperature Coefficient: X5R; RoHS: Yes; ComponentLink1Description: Datasheet; ComponentLink1URL: https://wmsc.lcsc.com/wmsc/upload/file/pdf/v2/lcsc/2304140030_Kyocera-AVX-04026D474KAT2A_C597049.pdf; ComponentLink2Description: JLCPCB Part URL; ComponentLink2URL: https://jlcpcb.com/partdetail/C597049; ComponentLink3Description: LCSC Part URL; ComponentLink3URL: https://lcsc.com/product-detail/Multilayer-Ceramic-Capacitors-MLCC---SMD-SMT_Kyocera-AVX-Kyocera-AVX-04026D474KAT2A_C597049.html
footprint CAP-0402 (0402 (1005M) Capacitor)
pins: 1, 2

## 04026D475MAT2A
designator C?  Capacitance: 4.7uF  (hidden comment: *)
Capacitor, Ceramic (MLCC), 4.7uF, ±20%, 6.3V, X5R, ±20%, SMD 0402; Manufacturer: Kyocera AVX; Manufacturer Part Number: 04026D475MAT2A; Package Size: 0402; JLCPCB Basic Part: No; JLCPCB Part Number: C2170363; Supplier 1: LCSC; Category: Capacitors - MLCC; Supplier Part Number 1: C2170363; Tolerance: ±20%; Voltage Rating: 6.3V; Temperature Coefficient: X5R; RoHS: Yes; ComponentLink1Description: Datasheet; ComponentLink1URL: https://wmsc.lcsc.com/wmsc/upload/file/pdf/v2/lcsc/2304140030_Kyocera-AVX-04026D475MAT2A_C2170363.pdf; ComponentLink2Description: JLCPCB Part URL; ComponentLink2URL: https://jlcpcb.com/partdetail/C2170363; ComponentLink3Description: LCSC Part URL; ComponentLink3URL: https://lcsc.com/product-detail/Multilayer-Ceramic-Capacitors-MLCC---SMD-SMT_Kyocera-AVX-Kyocera-AVX-04026D475MAT2A_C2170363.html
footprint CAP-0402 (0402 (1005M) Capacitor)
pins: 1, 2

## 885012105001
designator C?  Capacitance: 100nF  (hidden comment: *)
Capacitor, Ceramic (MLCC), 100nF, ±20%, 6.3V, X5R, ±20%, SMD 0402; Manufacturer: Wurth Elektronik; Manufacturer Part Number: 885012105001; Package Size: 0402; JLCPCB Basic Part: No; JLCPCB Part Number: C2176873; Supplier 1: LCSC; Category: Capacitors - MLCC; Supplier Part Number 1: C2176873; Tolerance: ±20%; Voltage Rating: 6.3V; Temperature Coefficient: X5R; RoHS: Yes; ComponentLink1Description: Datasheet; ComponentLink1URL: https://wmsc.lcsc.com/wmsc/upload/file/pdf/v2/lcsc/2401181239_Wurth-Elektronik-885012105001_C2176873.pdf; ComponentLink2Description: JLCPCB Part URL; ComponentLink2URL: https://jlcpcb.com/partdetail/C2176873; ComponentLink3Description: LCSC Part URL; ComponentLink3URL: https://lcsc.com/product-detail/Multilayer-Ceramic-Capacitors-MLCC---SMD-SMT_Wurth-Elektronik-Wurth-Elektronik-885012105001_C2176873.html
footprint CAP-0402 (0402 (1005M) Capacitor)
pins: 1, 2

## AC0402BRNPO9BN1R0
designator C?  Capacitance: 1pF  (hidden comment: *)
Capacitor, Ceramic (MLCC), 1pF, 50V, NP0, SMD 0402; Manufacturer: YAGEO; Manufacturer Part Number: AC0402BRNPO9BN1R0; Package Size: 0402; JLCPCB Basic Part: No; JLCPCB Part Number: C326823; Supplier 1: LCSC; Category: Capacitors - MLCC; Supplier Part Number 1: C326823; Voltage Rating: 50V; Temperature Coefficient: NP0; RoHS: Yes; ComponentLink1Description: Datasheet; ComponentLink1URL: https://wmsc.lcsc.com/wmsc/upload/file/pdf/v2/lcsc/1811151648_YAGEO-AC0402BRNPO9BN1R0_C326823.pdf; ComponentLink2Description: JLCPCB Part URL; ComponentLink2URL: https://jlcpcb.com/partdetail/C326823; ComponentLink3Description: LCSC Part URL; ComponentLink3URL: https://lcsc.com/product-detail/Multilayer-Ceramic-Capacitors-MLCC---SMD-SMT_YAGEO-YAGEO-AC0402BRNPO9BN1R0_C326823.html
footprint CAP-0402 (0402 (1005M) Capacitor)
pins: 1, 2

## AC0402BRNPO9BN1R2
designator C?  Capacitance: 1.2pF  (hidden comment: *)
Capacitor, Ceramic (MLCC), 1.2pF, 50V, NP0, SMD 0402; Manufacturer: YAGEO; Manufacturer Part Number: AC0402BRNPO9BN1R2; Package Size: 0402; JLCPCB Basic Part: No; JLCPCB Part Number: C2174092; Supplier 1: LCSC; Category: Capacitors - MLCC; Supplier Part Number 1: C2174092; Voltage Rating: 50V; Temperature Coefficient: NP0; RoHS: Yes; ComponentLink1Description: Datasheet; ComponentLink1URL: https://wmsc.lcsc.com/wmsc/upload/file/pdf/v2/lcsc/2202040700_YAGEO-AC0402BRNPO9BN1R2_C2174092.pdf; ComponentLink2Description: JLCPCB Part URL; ComponentLink2URL: https://jlcpcb.com/partdetail/C2174092; ComponentLink3Description: LCSC Part URL; ComponentLink3URL: https://lcsc.com/product-detail/Multilayer-Ceramic-Capacitors-MLCC---SMD-SMT_YAGEO-YAGEO-AC0402BRNPO9BN1R2_C2174092.html
footprint CAP-0402 (0402 (1005M) Capacitor)
pins: 1, 2

## AC0402BRNPO9BN1R5
designator C?  Capacitance: 1.5pF  (hidden comment: *)
Capacitor, Ceramic (MLCC), 1.5pF, 50V, NP0, SMD 0402; Manufacturer: YAGEO; Manufacturer Part Number: AC0402BRNPO9BN1R5; Package Size: 0402; JLCPCB Basic Part: No; JLCPCB Part Number: C326822; Supplier 1: LCSC; Category: Capacitors - MLCC; Supplier Part Number 1: C326822; Voltage Rating: 50V; Temperature Coefficient: NP0; RoHS: Yes; ComponentLink1Description: Datasheet; ComponentLink1URL: https://wmsc.lcsc.com/wmsc/upload/file/pdf/v2/lcsc/1811151648_YAGEO-AC0402BRNPO9BN1R5_C326822.pdf; ComponentLink2Description: JLCPCB Part URL; ComponentLink2URL: https://jlcpcb.com/partdetail/C326822; ComponentLink3Description: LCSC Part URL; ComponentLink3URL: https://lcsc.com/product-detail/Multilayer-Ceramic-Capacitors-MLCC---SMD-SMT_YAGEO-YAGEO-AC0402BRNPO9BN1R5_C326822.html
footprint CAP-0402 (0402 (1005M) Capacitor)
pins: 1, 2

## AC0402BRNPO9BN1R8
designator C?  Capacitance: 1.8pF  (hidden comment: *)
Capacitor, Ceramic (MLCC), 1.8pF, 50V, SMD 0402; Manufacturer: YAGEO; Manufacturer Part Number: AC0402BRNPO9BN1R8; Package Size: 0402; JLCPCB Basic Part: No; JLCPCB Part Number: C2838743; Supplier 1: LCSC; Category: Capacitors - MLCC; Supplier Part Number 1: C2838743; Voltage Rating: 50V; RoHS: Yes; ComponentLink1Description: Datasheet; ComponentLink1URL: https://wmsc.lcsc.com/wmsc/upload/file/pdf/v2/lcsc/2202131930_YAGEO-AC0402BRNPO9BN1R8_C2838743.pdf; ComponentLink2Description: JLCPCB Part URL; ComponentLink2URL: https://jlcpcb.com/partdetail/C2838743; ComponentLink3Description: LCSC Part URL; ComponentLink3URL: https://lcsc.com/product-detail/Multilayer-Ceramic-Capacitors-MLCC---SMD-SMT_YAGEO-YAGEO-AC0402BRNPO9BN1R8_C2838743.html
footprint CAP-0402 (0402 (1005M) Capacitor)
pins: 1, 2

## AC0402BRNPO9BN2R2
designator C?  Capacitance: 2.2pF  (hidden comment: *)
Capacitor, Ceramic (MLCC), 2.2pF, 50V, NP0, SMD 0402; Manufacturer: YAGEO; Manufacturer Part Number: AC0402BRNPO9BN2R2; Package Size: 0402; JLCPCB Basic Part: No; JLCPCB Part Number: C326820; Supplier 1: LCSC; Category: Capacitors - MLCC; Supplier Part Number 1: C326820; Voltage Rating: 50V; Temperature Coefficient: NP0; RoHS: Yes; ComponentLink1Description: Datasheet; ComponentLink1URL: https://wmsc.lcsc.com/wmsc/upload/file/pdf/v2/lcsc/1811151648_YAGEO-AC0402BRNPO9BN2R2_C326820.pdf; ComponentLink2Description: JLCPCB Part URL; ComponentLink2URL: https://jlcpcb.com/partdetail/C326820; ComponentLink3Description: LCSC Part URL; ComponentLink3URL: https://lcsc.com/product-detail/Multilayer-Ceramic-Capacitors-MLCC---SMD-SMT_YAGEO-YAGEO-AC0402BRNPO9BN2R2_C326820.html
footprint CAP-0402 (0402 (1005M) Capacitor)
pins: 1, 2

## AC0402BRNPO9BN2R4
designator C?  Capacitance: 2.4pF  (hidden comment: *)
Capacitor, Ceramic (MLCC), 2.4pF, 50V, NP0, SMD 0402; Manufacturer: YAGEO; Manufacturer Part Number: AC0402BRNPO9BN2R4; Package Size: 0402; JLCPCB Basic Part: No; JLCPCB Part Number: C2180898; Supplier 1: LCSC; Category: Capacitors - MLCC; Supplier Part Number 1: C2180898; Voltage Rating: 50V; Temperature Coefficient: NP0; RoHS: Yes; ComponentLink1Description: Datasheet; ComponentLink1URL: https://wmsc.lcsc.com/wmsc/upload/file/pdf/v2/lcsc/2202081300_YAGEO-AC0402BRNPO9BN2R4_C2180898.pdf; ComponentLink2Description: JLCPCB Part URL; ComponentLink2URL: https://jlcpcb.com/partdetail/C2180898; ComponentLink3Description: LCSC Part URL; ComponentLink3URL: https://lcsc.com/product-detail/Multilayer-Ceramic-Capacitors-MLCC---SMD-SMT_YAGEO-YAGEO-AC0402BRNPO9BN2R4_C2180898.html
footprint CAP-0402 (0402 (1005M) Capacitor)
pins: 1, 2

## AC0402BRNPO9BN3R0
designator C?  Capacitance: 3pF  (hidden comment: *)
Capacitor, Ceramic (MLCC), 3pF, 50V, NP0, SMD 0402; Manufacturer: YAGEO; Manufacturer Part Number: AC0402BRNPO9BN3R0; Package Size: 0402; JLCPCB Basic Part: No; JLCPCB Part Number: C605206; Supplier 1: LCSC; Category: Capacitors - MLCC; Supplier Part Number 1: C605206; Voltage Rating: 50V; Temperature Coefficient: NP0; RoHS: Yes; ComponentLink1Description: Datasheet; ComponentLink1URL: https://wmsc.lcsc.com/wmsc/upload/file/pdf/v2/lcsc/2304140030_YAGEO-AC0402BRNPO9BN3R0_C605206.pdf; ComponentLink2Description: JLCPCB Part URL; ComponentLink2URL: https://jlcpcb.com/partdetail/C605206; ComponentLink3Description: LCSC Part URL; ComponentLink3URL: https://lcsc.com/product-detail/Multilayer-Ceramic-Capacitors-MLCC---SMD-SMT_YAGEO-YAGEO-AC0402BRNPO9BN3R0_C605206.html
footprint CAP-0402 (0402 (1005M) Capacitor)
pins: 1, 2

## AC0402BRNPO9BN3R9
designator C?  Capacitance: 3.9pF  (hidden comment: *)
Capacitor, Ceramic (MLCC), 3.9pF, 50V, NP0, SMD 0402; Manufacturer: YAGEO; Manufacturer Part Number: AC0402BRNPO9BN3R9; Package Size: 0402; JLCPCB Basic Part: No; JLCPCB Part Number: C326821; Supplier 1: LCSC; Category: Capacitors - MLCC; Supplier Part Number 1: C326821; Voltage Rating: 50V; Temperature Coefficient: NP0; RoHS: Yes; ComponentLink1Description: Datasheet; ComponentLink1URL: https://wmsc.lcsc.com/wmsc/upload/file/pdf/v2/lcsc/1811141225_YAGEO-AC0402BRNPO9BN3R9_C326821.pdf; ComponentLink2Description: JLCPCB Part URL; ComponentLink2URL: https://jlcpcb.com/partdetail/C326821; ComponentLink3Description: LCSC Part URL; ComponentLink3URL: https://lcsc.com/product-detail/Multilayer-Ceramic-Capacitors-MLCC---SMD-SMT_YAGEO-YAGEO-AC0402BRNPO9BN3R9_C326821.html
footprint CAP-0402 (0402 (1005M) Capacitor)
pins: 1, 2

## AC0402BRNPO9BN6R8
designator C?  Capacitance: 6.8pF  (hidden comment: *)
Capacitor, Ceramic (MLCC), 6.8pF, 50V, SMD 0402; Manufacturer: YAGEO; Manufacturer Part Number: AC0402BRNPO9BN6R8; Package Size: 0402; JLCPCB Basic Part: No; JLCPCB Part Number: C726101; Supplier 1: LCSC; Category: Capacitors - MLCC; Supplier Part Number 1: C726101; Voltage Rating: 50V; RoHS: Yes; ComponentLink1Description: Datasheet; ComponentLink1URL: https://wmsc.lcsc.com/wmsc/upload/file/pdf/v2/lcsc/2105241335_YAGEO-AC0402BRNPO9BN6R8_C726101.pdf; ComponentLink2Description: JLCPCB Part URL; ComponentLink2URL: https://jlcpcb.com/partdetail/C726101; ComponentLink3Description: LCSC Part URL; ComponentLink3URL: https://lcsc.com/product-detail/Multilayer-Ceramic-Capacitors-MLCC---SMD-SMT_YAGEO-YAGEO-AC0402BRNPO9BN6R8_C726101.html
footprint CAP-0402 (0402 (1005M) Capacitor)
pins: 1, 2

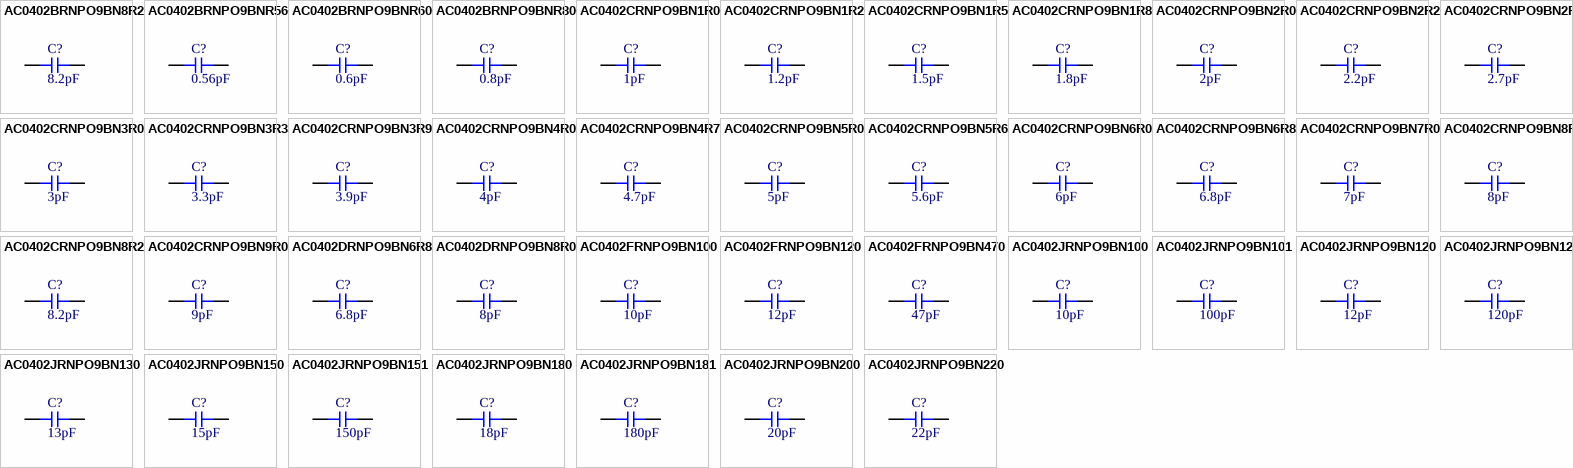
[diagram p17: symbols AC0402BRNPO9BN8R2 to AC0402JRNPO9BN220]

## AC0402BRNPO9BN8R2
designator C?  Capacitance: 8.2pF  (hidden comment: *)
Capacitor, Ceramic (MLCC), 8.2pF, 50V, NP0, SMD 0402; Manufacturer: YAGEO; Manufacturer Part Number: AC0402BRNPO9BN8R2; Package Size: 0402; JLCPCB Basic Part: No; JLCPCB Part Number: C326824; Supplier 1: LCSC; Category: Capacitors - MLCC; Supplier Part Number 1: C326824; Voltage Rating: 50V; Temperature Coefficient: NP0; RoHS: Yes; ComponentLink1Description: Datasheet; ComponentLink1URL: https://wmsc.lcsc.com/wmsc/upload/file/pdf/v2/lcsc/1811141234_YAGEO-AC0402BRNPO9BN8R2_C326824.pdf; ComponentLink2Description: JLCPCB Part URL; ComponentLink2URL: https://jlcpcb.com/partdetail/C326824; ComponentLink3Description: LCSC Part URL; ComponentLink3URL: https://lcsc.com/product-detail/Multilayer-Ceramic-Capacitors-MLCC---SMD-SMT_YAGEO-YAGEO-AC0402BRNPO9BN8R2_C326824.html
footprint CAP-0402 (0402 (1005M) Capacitor)
pins: 1, 2

## AC0402BRNPO9BNR56
designator C?  Capacitance: 0.56pF  (hidden comment: *)
Capacitor, Ceramic (MLCC), 0.56pF, 50V, SMD 0402; Manufacturer: YAGEO; Manufacturer Part Number: AC0402BRNPO9BNR56; Package Size: 0402; JLCPCB Basic Part: No; JLCPCB Part Number: C726103; Supplier 1: LCSC; Category: Capacitors - MLCC; Supplier Part Number 1: C726103; Voltage Rating: 50V; RoHS: Yes; ComponentLink1Description: Datasheet; ComponentLink1URL: https://wmsc.lcsc.com/wmsc/upload/file/pdf/v2/lcsc/2012141239_YAGEO-AC0402BRNPO9BNR56_C726103.pdf; ComponentLink2Description: JLCPCB Part URL; ComponentLink2URL: https://jlcpcb.com/partdetail/C726103; ComponentLink3Description: LCSC Part URL; ComponentLink3URL: https://lcsc.com/product-detail/Multilayer-Ceramic-Capacitors-MLCC---SMD-SMT_YAGEO-YAGEO-AC0402BRNPO9BNR56_C726103.html
footprint CAP-0402 (0402 (1005M) Capacitor)
pins: 1, 2

## AC0402BRNPO9BNR60
designator C?  Capacitance: 0.6pF  (hidden comment: *)
Capacitor, Ceramic (MLCC), 0.6pF, 50V, NP0, SMD 0402; Manufacturer: YAGEO; Manufacturer Part Number: AC0402BRNPO9BNR60; Package Size: 0402; JLCPCB Basic Part: No; JLCPCB Part Number: C1853313; Supplier 1: LCSC; Category: Capacitors - MLCC; Supplier Part Number 1: C1853313; Voltage Rating: 50V; Temperature Coefficient: NP0; RoHS: Yes; ComponentLink1Description: Datasheet; ComponentLink1URL: https://wmsc.lcsc.com/wmsc/upload/file/pdf/v2/lcsc/2112131830_YAGEO-AC0402BRNPO9BNR60_C1853313.pdf; ComponentLink2Description: JLCPCB Part URL; ComponentLink2URL: https://jlcpcb.com/partdetail/C1853313; ComponentLink3Description: LCSC Part URL; ComponentLink3URL: https://lcsc.com/product-detail/Multilayer-Ceramic-Capacitors-MLCC---SMD-SMT_YAGEO-YAGEO-AC0402BRNPO9BNR60_C1853313.html
footprint CAP-0402 (0402 (1005M) Capacitor)
pins: 1, 2

## AC0402BRNPO9BNR80
designator C?  Capacitance: 0.8pF  (hidden comment: *)
Capacitor, Ceramic (MLCC), 0.8pF, 50V, NP0, SMD 0402; Manufacturer: YAGEO; Manufacturer Part Number: AC0402BRNPO9BNR80; Package Size: 0402; JLCPCB Basic Part: No; JLCPCB Part Number: C2192884; Supplier 1: LCSC; Category: Capacitors - MLCC; Supplier Part Number 1: C2192884; Voltage Rating: 50V; Temperature Coefficient: NP0; RoHS: Yes; ComponentLink1Description: Datasheet; ComponentLink1URL: https://wmsc.lcsc.com/wmsc/upload/file/pdf/v2/lcsc/2304140030_YAGEO-AC0402BRNPO9BNR80_C2192884.pdf; ComponentLink2Description: JLCPCB Part URL; ComponentLink2URL: https://jlcpcb.com/partdetail/C2192884; ComponentLink3Description: LCSC Part URL; ComponentLink3URL: https://lcsc.com/product-detail/Multilayer-Ceramic-Capacitors-MLCC---SMD-SMT_YAGEO-YAGEO-AC0402BRNPO9BNR80_C2192884.html
footprint CAP-0402 (0402 (1005M) Capacitor)
pins: 1, 2

## AC0402CRNPO9BN1R0
designator C?  Capacitance: 1pF  (hidden comment: *)
Capacitor, Ceramic (MLCC), 1pF, 50V, NP0, SMD 0402; Manufacturer: YAGEO; Manufacturer Part Number: AC0402CRNPO9BN1R0; Package Size: 0402; JLCPCB Basic Part: No; JLCPCB Part Number: C2180887; Supplier 1: LCSC; Category: Capacitors - MLCC; Supplier Part Number 1: C2180887; Voltage Rating: 50V; Temperature Coefficient: NP0; RoHS: Yes; ComponentLink1Description: Datasheet; ComponentLink1URL: https://wmsc.lcsc.com/wmsc/upload/file/pdf/v2/lcsc/2202041130_YAGEO-AC0402CRNPO9BN1R0_C2180887.pdf; ComponentLink2Description: JLCPCB Part URL; ComponentLink2URL: https://jlcpcb.com/partdetail/C2180887; ComponentLink3Description: LCSC Part URL; ComponentLink3URL: https://lcsc.com/product-detail/Multilayer-Ceramic-Capacitors-MLCC---SMD-SMT_YAGEO-YAGEO-AC0402CRNPO9BN1R0_C2180887.html
footprint CAP-0402 (0402 (1005M) Capacitor)
pins: 1, 2

## AC0402CRNPO9BN1R2
designator C?  Capacitance: 1.2pF  (hidden comment: *)
Capacitor, Ceramic (MLCC), 1.2pF, 50V, NP0, SMD 0402; Manufacturer: YAGEO; Manufacturer Part Number: AC0402CRNPO9BN1R2; Package Size: 0402; JLCPCB Basic Part: No; JLCPCB Part Number: C726104; Supplier 1: LCSC; Category: Capacitors - MLCC; Supplier Part Number 1: C726104; Voltage Rating: 50V; Temperature Coefficient: NP0; RoHS: Yes; ComponentLink1Description: Datasheet; ComponentLink1URL: https://wmsc.lcsc.com/wmsc/upload/file/pdf/v2/lcsc/2009191608_YAGEO-AC0402CRNPO9BN1R2_C726104.pdf; ComponentLink2Description: JLCPCB Part URL; ComponentLink2URL: https://jlcpcb.com/partdetail/C726104; ComponentLink3Description: LCSC Part URL; ComponentLink3URL: https://lcsc.com/product-detail/Multilayer-Ceramic-Capacitors-MLCC---SMD-SMT_YAGEO-YAGEO-AC0402CRNPO9BN1R2_C726104.html
footprint CAP-0402 (0402 (1005M) Capacitor)
pins: 1, 2
